# Altium footprint library common_pcblib.PcbLib: 54 footprints (part 1 of 4)
Each footprint in its own frame and in the unit in brackets; x right, y up, seen from the top. Pads: shape width x height; smd on the part's side, far side on the other; paste and mask are expansions set on the pad; w line width, h text height; cw(c..) or ccw(c..) is an arc to the next point about the centre after c.
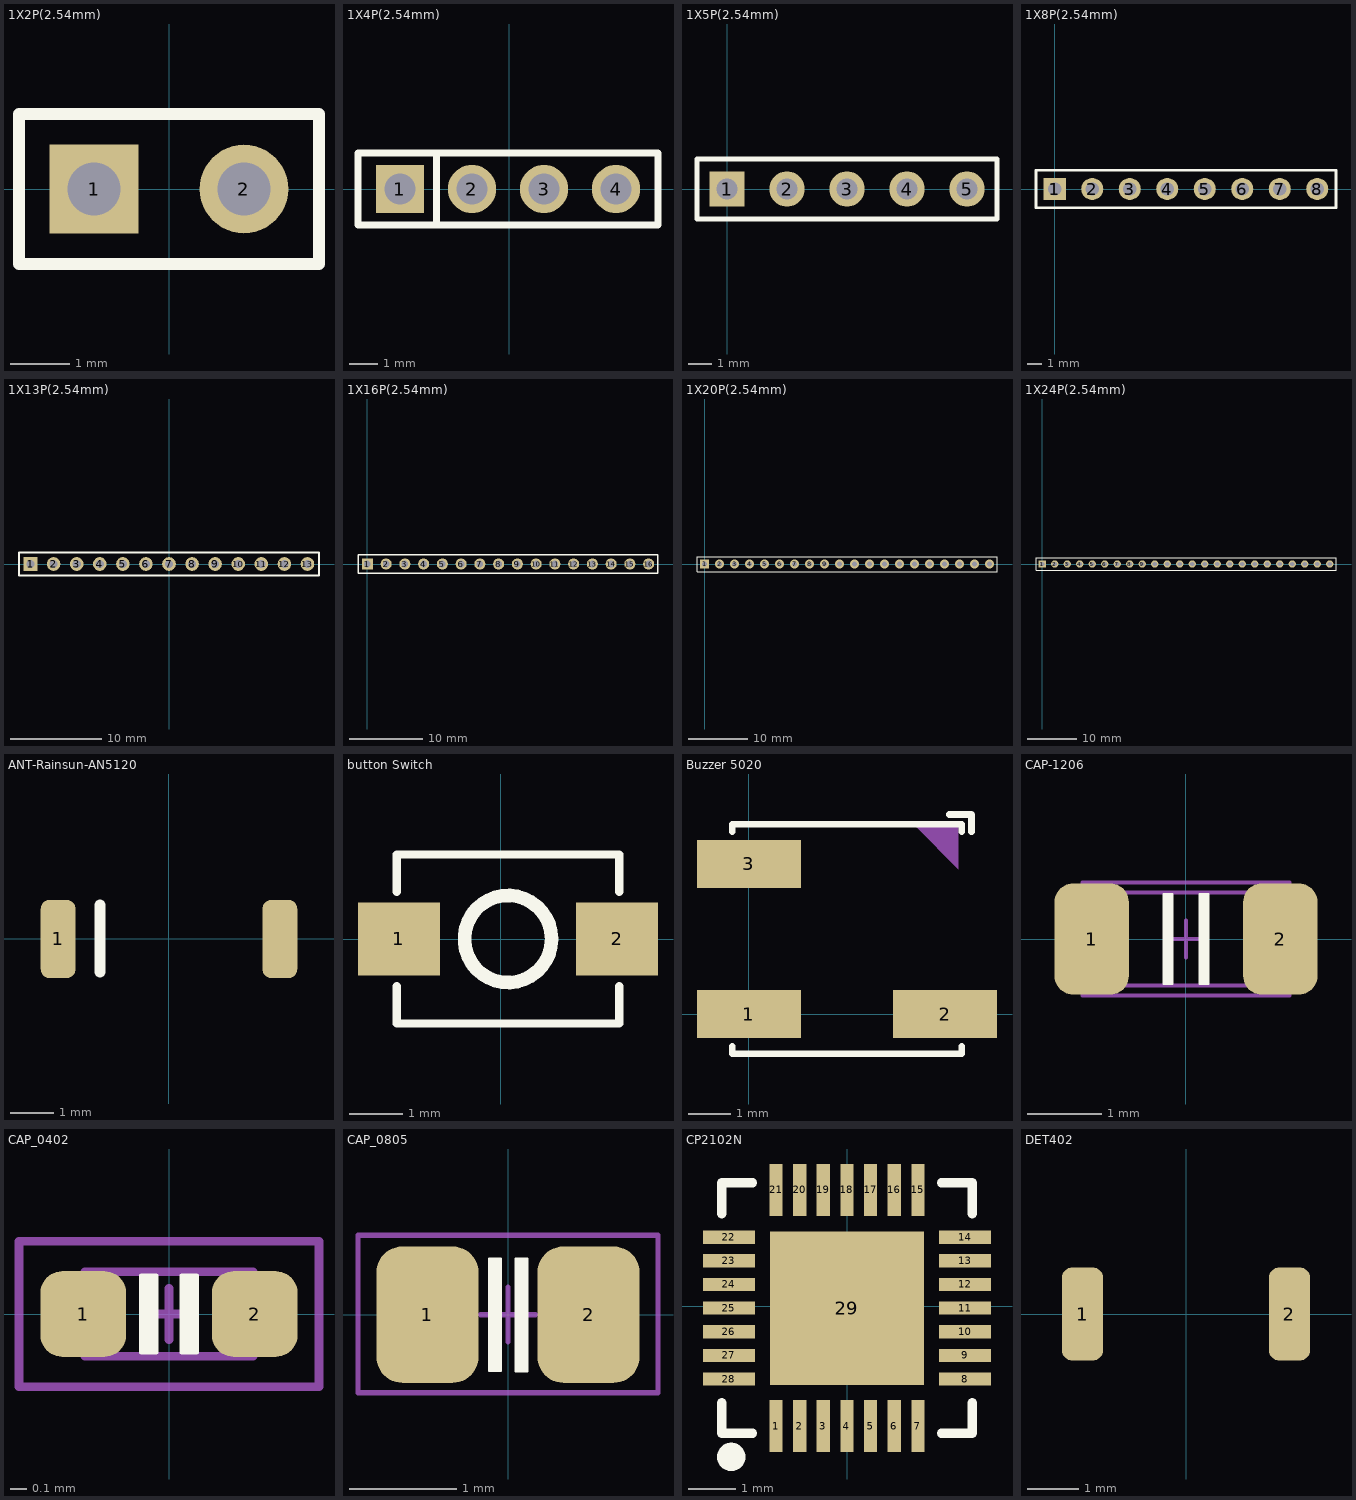
[diagram p0: the footprints below, top view; thin cyan lines are the x and y axes]

## 1X2P(2.54mm) [mm]
pads (2):
  rect 1.5x1.5 hole 0.9: 1(-1.27,0)
  round 1.5 hole 0.9: 2(1.27,0)
Top Overlay:
  lines w0.2: -2.54,-1.27 -2.54,1.27 2.54,1.27 2.54,-1.27 -2.54,-1.27
3D body "1001-2.STEP": height 8.54, standoff -3, extent -2.54,-1.27 2.54,1.27

## 1X4P(2.54mm) [mm]
pads (4):
  rect 1.7x1.7 hole 1.1: 1(-3.854,0)
  round 1.7 hole 1.1: 2(-1.314,0) 3(1.226,0) 4(3.766,0)
Top Overlay:
  lines w0.254: -2.56,-1.27 -2.56,1.27 ; -5.334,-1.27 -5.334,1.27 5.246,1.27 5.246,-1.27 -5.334,-1.27
Mechanical 15:
  lines w0.003: 1.137,0.102 1.188,0.152
3D body "1001-4.STEP": height 8.54, standoff -3, extent -4.953,-1.397 5.207,1.143

## 1X5P(2.54mm) [mm]
pads (5):
  rect 1.5x1.5 hole 0.9: 1(0,0)
  round 1.5 hole 0.9: 2(2.54,0) 3(5.08,0) 4(7.62,0) 5(10.16,0)
Top Overlay:
  lines w0.2: -1.27,-1.27 -1.27,1.27 11.43,1.27 11.43,-1.27 -1.27,-1.27
3D body "1001-5.STEP": height 8.54, standoff -3, extent -1.27,-1.27 11.43,1.27

## 1X8P(2.54mm) [mm]
pads (8):
  rect 1.5x1.5 hole 0.9: 1(0,0)
  round 1.5 hole 0.9: 2(2.54,0) 3(5.08,0) 4(7.62,0) 5(10.16,0) 6(12.7,0) 7(15.24,0) 8(17.78,0)
Top Overlay:
  lines w0.2: -1.27,-1.27 -1.27,1.27 19.05,1.27 19.05,-1.27 -1.27,-1.27
3D body "1001-4.STEP": height 8.54, standoff -3, extent -1.27,-1.27 8.89,1.27
3D body "1001-4.STEP": height 8.54, standoff -3, extent 8.89,-1.27 19.05,1.27

## 1X13P(2.54mm) [mm]
pads (13):
  rect 1.5x1.5 hole 0.9: 1(-15.24,0)
  round 1.5 hole 0.9: 2(-12.7,0) 3(-10.16,0) 4(-7.62,0) 5(-5.08,0) 6(-2.54,0) 7(0,0) 8(2.54,0) 9(5.08,0) 10(7.62,0) 11(10.16,0) 12(12.7,0) 13(15.24,0)
Top Overlay:
  lines w0.2: -16.51,-1.27 -16.51,1.27 -14.605,1.27 16.51,1.27 16.51,-1.27 -16.51,-1.27
3D body "1001-5.STEP": height 8.54, standoff -3, extent 3.81,-1.27 16.51,1.27
3D body "1001-8.STEP": height 8.54, standoff -3, extent -16.383,-1.27 3.937,1.27

## 1X16P(2.54mm) [mm]
pads (16):
  rect 1.5x1.5 hole 0.9: 1(0,0)
  round 1.5 hole 0.9: 2(2.54,0) 3(5.08,0) 4(7.62,0) 5(10.16,0) 6(12.7,0) 7(15.24,0) 8(17.78,0) 9(20.32,0) 10(22.86,0) 11(25.4,0) 12(27.94,0) 13(30.48,0) 14(33.02,0) 15(35.56,0) 16(38.1,0)
Top Overlay:
  lines w0.2: -1.27,-1.27 -1.27,1.27 0.635,1.27 39.37,1.27 39.37,-1.27 -1.27,-1.27
3D body "1001-4.STEP": height 8.54, standoff -3, extent 29.21,-1.27 39.37,1.27
3D body "1001-4.STEP": height 8.54, standoff -3, extent 19.05,-1.27 29.21,1.27
3D body "1001-4.STEP": height 8.54, standoff -3, extent 8.89,-1.27 19.05,1.27
3D body "1001-4.STEP": height 8.54, standoff -3, extent -1.27,-1.27 8.89,1.27

## 1X20P(2.54mm) [mm]
pads (20):
  rect 1.5x1.5 hole 0.9: 1(0,0)
  round 1.5 hole 0.9: 2(2.54,0) 3(5.08,0) 4(7.62,0) 5(10.16,0) 6(12.7,0) 7(15.24,0) 8(17.78,0) 9(20.32,0) 10(22.86,0) 11(25.4,0) 12(27.94,0) 13(30.48,0) 14(33.02,0) 15(35.56,0) 16(38.1,0) 17(40.64,0) 18(43.18,0) 19(45.72,0) 20(48.26,0)
Top Overlay:
  lines w0.2: -1.27,-1.27 -1.27,1.27 0.635,1.27 49.53,1.27 49.53,-1.27 -1.27,-1.27
3D body "1001-4.STEP": height 8.54, standoff -3, extent 39.37,-1.397 49.53,1.143
3D body "1001-4.STEP": height 8.54, standoff -3, extent 29.21,-1.397 39.37,1.143
3D body "1001-4.STEP": height 8.54, standoff -3, extent 19.05,-1.397 29.21,1.143
3D body "1001-4.STEP": height 8.54, standoff -3, extent 8.89,-1.397 19.05,1.143
3D body "1001-4.STEP": height 8.54, standoff -3, extent -1.27,-1.397 8.89,1.143

## 1X24P(2.54mm) [mm]
pads (24):
  rect 1.5x1.5 hole 0.9: 1(0,0)
  round 1.5 hole 0.9: 2(2.54,0) 3(5.08,0) 4(7.62,0) 5(10.16,0) 6(12.7,0) 7(15.24,0) 8(17.78,0) 9(20.32,0) 10(22.86,0) 11(25.4,0) 12(27.94,0) 13(30.48,0) 14(33.02,0) 15(35.56,0) 16(38.1,0) 17(40.64,0) 18(43.18,0) 19(45.72,0) 20(48.26,0) 21(50.8,0) 22(53.34,0) 23(55.88,0) 24(58.42,0)
Top Overlay:
  lines w0.2: -1.27,-1.27 59.69,-1.27 59.69,1.27 0.635,1.27 -1.27,1.27 -1.27,-1.27
3D body "1001-8.STEP": height 3, standoff -8.54, extent -1.27,-1.27 19.05,1.27
3D body "1001-8.STEP": height 3, standoff -8.54, extent 19.05,-1.27 39.37,1.27
3D body "1001-8.STEP": height 3, standoff -8.54, extent 39.37,-1.27 59.69,1.27

## ANT-Rainsun-AN5120 [mm]
pads (2):
  rrect50% 0.8x1.8 smd: 1(-2.54,0) ""(2.563,0)
Top Overlay:
  lines w0.254: -1.575,-0.762 -1.575,0.787
3D body "123.stp": height 1.32, standoff -0.01, extent -2.573,-0.911 2.542,0.935

## button Switch [mm]
pads (2):
  rect 1.53x1.36 smd: 1(-1.902,0.001) 2(2.168,0.001)
Top Overlay:
  circle w0.254: c0.133,0.001 r0.813
  lines w0.152: -1.943,-0.882 -1.943,-1.575 2.209,-1.575 2.209,-0.882 ; -1.943,0.885 -1.943,1.578 2.209,1.578 2.209,0.885
Mechanical 15:
  lines w0.003: 1.505,0.103 1.555,0.154
3D body "User Library-User Library-Micro Pushbutton.step": height 1.63, standoff 0, extent -1.873,-1.184 2.127,1.184

## Buzzer 5020 [mm] "buzzer"
pads (3):
  rect 2.425x1.12 smd: 1(0,0) 2(4.575,0) 3(0,3.5)
Top Overlay:
  lines w0.152: -0.389,-0.75 -0.389,-0.926 4.964,-0.926 4.964,-0.75 ; -0.389,4.251 -0.389,4.426 4.964,4.426 4.964,4.251 ; 4.672,4.655 5.192,4.655 5.192,4.579 5.192,4.251
Mechanical 15:
  region: 3.887,4.38 4.887,4.38 4.887,3.38
3D body "User Library-BEEP-5020.step": height 2, standoff -0.1, extent -0.314,-0.822 4.886,4.378

## CAP-1206 [mm]
pads (2):
  rrect50% 1x1.5 smd mask+0: 1(-1.27,0) 2(1.27,0)
Top Overlay:
  region: 0.305,-0.61 0.178,-0.61 0.178,0.61 0.305,0.61
  region: -0.305,0.61 -0.178,0.61 -0.178,-0.61 -0.305,-0.61
  lines w0.025: -0.305,-0.61 -0.305,0.61 -0.178,0.61 -0.178,-0.61 -0.305,-0.61 ; 0.178,-0.61 0.305,-0.61 0.305,0.61 0.178,0.61 0.178,-0.61
Mechanical 13:
  lines w0.051: -0.254,0 0.254,0 ; 0,-0.254 0,0.254 ; -1,-0.625 1,-0.625 1,0.625 -1,0.625 -1,-0.625
Mechanical 14:
  lines w0.051: -1.397,-0.762 1.397,-0.762 1.397,0.762 -1.397,0.762 -1.397,-0.762
3D body "(未保存).step": height 1.5, standoff 0, extent -1.5,-0.75 1.5,0.75

## CAP_0402 [mil]
pads (2):
  rrect50% 20x20 smd mask+0: 1(-20,0) 2(20,0)
Top Overlay:
  region: -6.5,9 -3,9 -3,-9 -6.5,-9
  region: 6.5,-9 3,-9 3,9 6.5,9
  lines w1: -6.5,-9 -3,-9 -3,9 -6.5,9 -6.5,-9 ; 3,-9 3,9 6.5,9 6.5,-9 3,-9
Mechanical 13:
  lines w2: -6,0 6,0 ; 0,-6 0,6 ; -19.69,-9.84 -19.69,9.84 19.68,9.84 19.68,-9.84 -19.69,-9.84
Mechanical 14:
  lines w2: -35,-17 -35,17 35,17 35,-17 -35,-17
3D body "CAPC1005X05L.step": height 19.68, standoff 0, extent -19.68,-9.84 19.69,9.85

## CAP_0805 [mm]
pads (2):
  rrect50% 0.95x1.27 smd paste+0 mask+0: 1(-0.75,0) 2(0.75,0)
Top Overlay:
  region: -0.175,0.521 -0.078,0.521 -0.078,-0.523 -0.175,-0.523
  region: 0.073,0.518 0.17,0.518 0.17,-0.526 0.073,-0.526
  lines w0.025: -0.175,-0.523 -0.07,-0.523 -0.07,0.521 -0.175,0.521 -0.175,-0.523 ; 0.073,-0.526 0.178,-0.526 0.178,0.518 0.073,0.518 0.073,-0.526
Mechanical 13:
  lines w0.051: -0.254,0 0.254,0 ; 0,-0.254 0,0.254
Mechanical 14:
  lines w0.051: -1.397,-0.729 1.397,-0.729 1.397,0.74 -1.397,0.74 -1.397,-0.729
3D body "Cap_KEMET_C0805C472J3HAC_eec.STEP": height 0.88, standoff 0, extent -1,-0.625 1,0.625

## CP2102N [mm] "QFN28 5*5"
pads (29):
  rect 0.28x1.1 smd: 1(-1.509,-2.54) 2(-1.008,-2.54) 3(-0.508,-2.54) 4(-0.008,-2.54) 5(0.493,-2.54) 6(0.993,-2.54) 7(1.494,-2.54) 15(1.494,2.46) 16(0.993,2.46) 17(0.493,2.46) 18(-0.008,2.46) 19(-0.508,2.46) 20(-1.008,2.46) 21(-1.509,2.46)
  rect 1.1x0.28 smd: 8(2.493,-1.541) 9(2.493,-1.041) 10(2.493,-0.541) 11(2.493,-0.04) 12(2.493,0.46) 13(2.493,0.961) 14(2.493,1.461) 22(-2.507,1.461) 23(-2.507,0.961) 24(-2.507,0.46) 25(-2.507,-0.04) 26(-2.507,-0.541) 27(-2.507,-1.041) 28(-2.507,-1.541)
  rect 3.25x3.25 smd: 29(-0.008,-0.04)
Top Overlay:
  lines w0.2: -2.658,-2.04 -2.658,-2.69 -2.008,-2.69 ; -2.658,1.96 -2.658,2.61 -2.008,2.61 ; 1.992,-2.69 2.642,-2.69 2.642,-2.04 ; 1.992,2.61 2.642,2.61 2.642,1.96
  lines w0.3: -2.459,-3.04 ccw(c-2.458,-3.19) -2.456,-3.04
3D body "User Library-CP2102.step": height 0.97, standoff 0, extent -2.585,-2.632 2.555,2.508

## DET402 [mm]
pads (2):
  rrect50% 0.8x1.8 smd: 1(-2,0) 2(2,0)
3D body "User Library-DET402.STEP": height 2.03, standoff -0.02, extent -2.451,-1.5 2.44,1.5